# Altium footprint library CI.PcbLib: 42 footprints (part 1 of 3)
Each footprint in its own frame and in the unit in brackets; x right, y up, seen from the top. Pads: shape width x height; smd on the part's side, far side on the other; paste and mask are expansions set on the pad; w line width, h text height; cw(c..) or ccw(c..) is an arc to the next point about the centre after c.
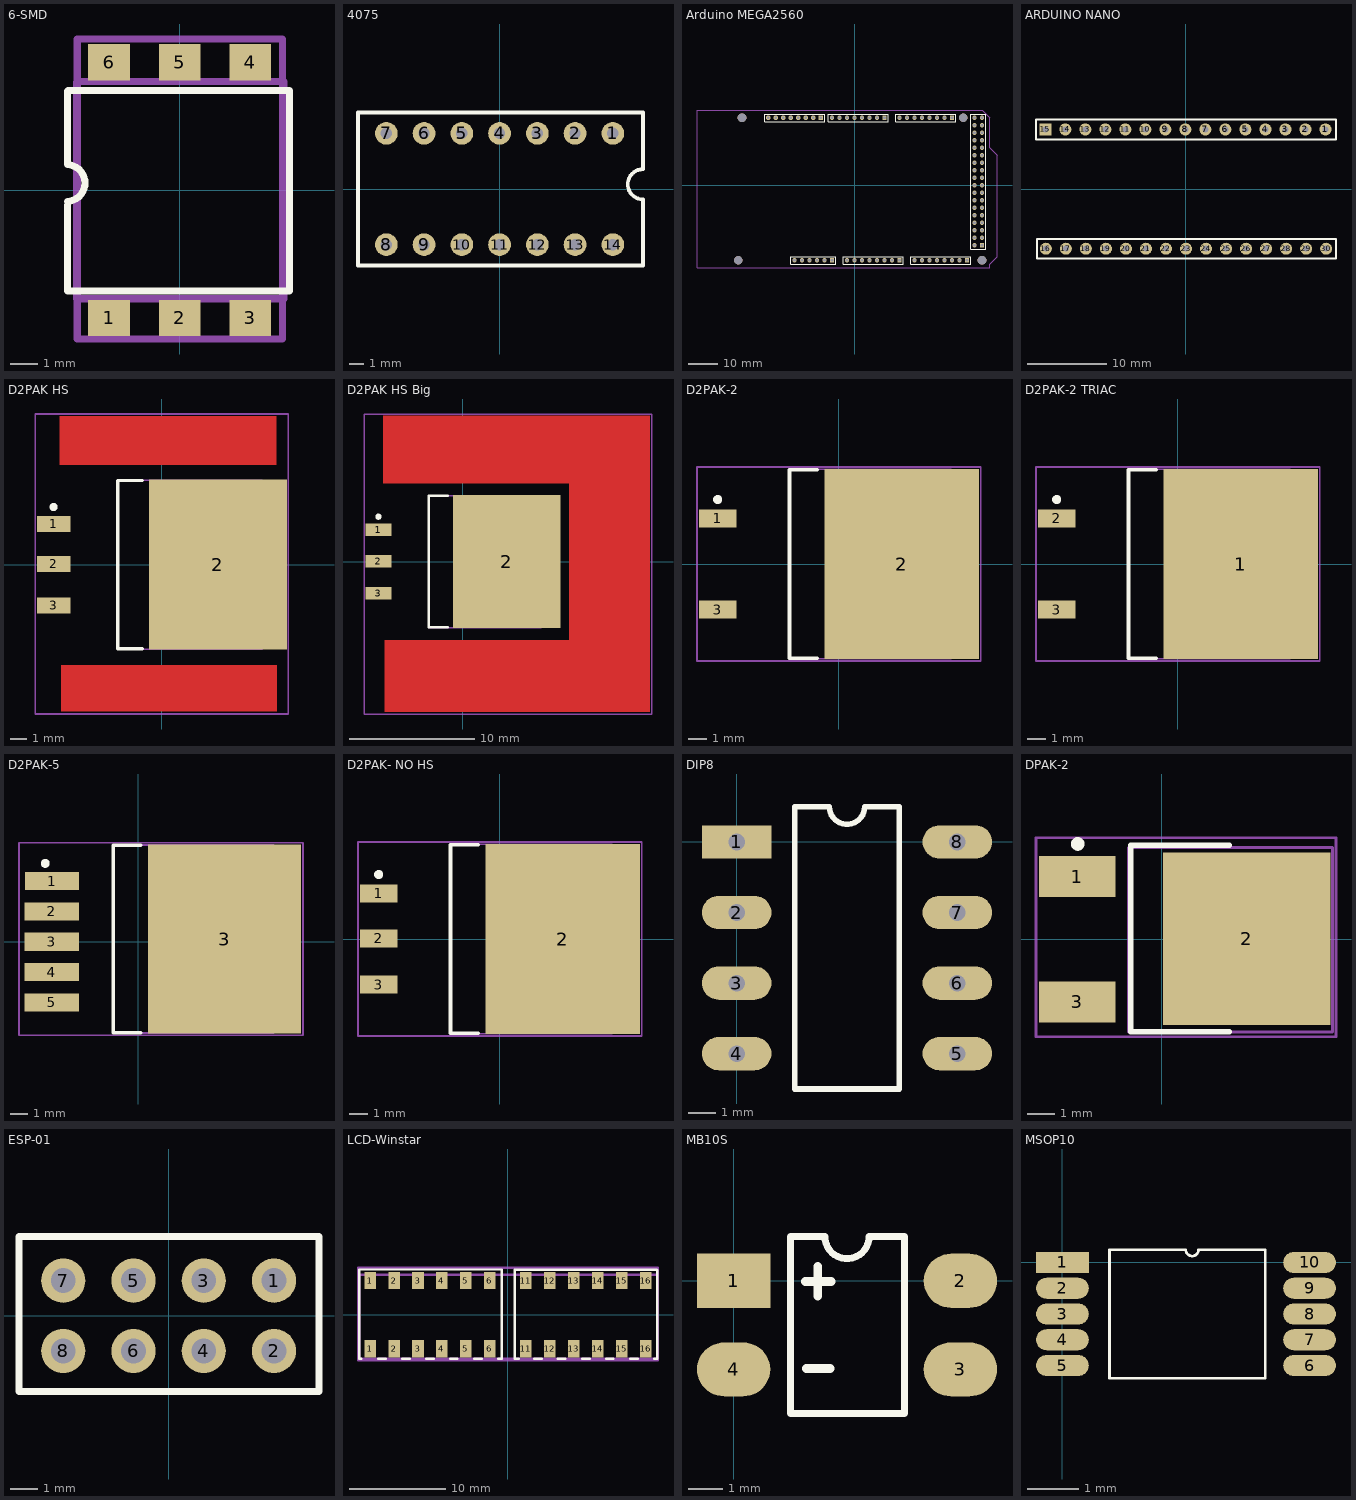
[diagram p0: the footprints below, top view; thin cyan lines are the x and y axes]

## 6-SMD [mm] "SMD IC 6 pins"
pads (6):
  rect 1.5x1.3 smd: 1(-2.54,-4.6) 2(0,-4.6) 3(2.54,-4.6) 4(2.54,4.6) 5(0,4.6) 6(-2.54,4.6)
Top Overlay:
  lines w0.254: -4.039,-0.531 -4.039,-3.63 3.962,-3.63 3.962,3.584 -4.013,3.584 ; -4.039,3.559 -4.039,0.917 cw(c-4.064,0.257) -4.038,-0.404
Mechanical 13:
  lines w0.254: -3.708,3.889 -3.708,-3.909 3.759,-3.909 3.759,3.914 -3.683,3.914
Mechanical 15:
  lines w0.254: -3.683,-5.357 3.708,-5.357 3.708,5.438 -3.683,5.438 -3.683,-5.357
3D body: height 3.61, standoff 0, extent -3.658,-5.052 3.632,5.108

## 4075 [mil] "4075 DIP14 Package"
pads (14):
  round 60 hole 30: 1(300,147.5) 2(200,147.5) 3(100,147.5) 4(0,147.5) 5(-100,147.5) 6(-200,147.5) 7(-300,147.5) 8(-300,-147.5) 9(-200,-147.5) 10(-100,-147.5) 11(0,-147.5) 12(100,-147.5) 13(200,-147.5) 14(300,-147.5)
Top Overlay:
  lines w10: -375,-202.5 380,-202.5 380,-27.5 cw(c379.69,12.5) 380,52.5 380,202.5 -375,202.5 -375,-202.5
3D body: height 326.77, standoff -98.43, extent -379.92,-197.11 379.92,202.1

## Arduino MEGA2560 [mm] "Arduino Mega2560"
pads (82):
  rect 1.5x1.5 hole 0.9: 0(10.16,22.86) 8(-11.43,22.86) 21(33.02,22.86) 59(-7.62,-25.4) 67(15.24,-25.4) 75(38.1,-25.4) 79(43.18,-20.32)
  round 1.5 hole 0.9: 1(7.62,22.86) 2(5.08,22.86) 3(2.54,22.86) 4(0,22.86) 5(-2.54,22.86) 6(-5.08,22.86) 7(-7.62,22.86) 9(-13.97,22.86) 10(-16.51,22.86) 11(-19.05,22.86) 12(-21.59,22.86) 13(-24.13,22.86) 14(15.24,22.86) 15(17.78,22.86) 16(20.32,22.86) 17(22.86,22.86) 18(25.4,22.86) 19(27.94,22.86) 20(30.48,22.86) 22(40.64,20.32) 23(43.18,20.32) 24(40.64,17.78) 25(43.18,17.78) 26(40.64,15.24) 27(43.18,15.24) 28(40.64,12.7) 29(43.18,12.7) 30(40.64,10.16) 31(43.18,10.16) 32(40.64,7.62) 33(43.18,7.62) 34(40.64,5.08) 35(43.18,5.08) 36(40.64,2.54) 37(43.18,2.54) 38(40.64,0) 39(43.18,0) 40(40.64,-2.54) 41(43.18,-2.54) 42(40.64,-5.08) 43(43.18,-5.08) 44(40.64,-7.62) 45(43.18,-7.62) 46(40.64,-10.16) 47(43.18,-10.16) 48(40.64,-12.7) 49(43.18,-12.7) 50(40.64,-15.24) 51(43.18,-15.24) 52(40.64,-17.78) 53(43.18,-17.78) 54(-20.32,-25.4) 55(-17.78,-25.4) 56(-15.24,-25.4) 57(-12.7,-25.4) 58(-10.16,-25.4) 60(-2.54,-25.4) 61(0,-25.4) 62(2.54,-25.4) 63(5.08,-25.4) 64(7.62,-25.4) 65(10.16,-25.4) 66(12.7,-25.4) 68(20.32,-25.4) 69(22.86,-25.4) 70(25.4,-25.4) 71(27.94,-25.4) 72(30.48,-25.4) 73(33.02,-25.4) 74(35.56,-25.4) 76(-26.67,22.86) 77(-29.21,22.86) 78(40.64,-20.32) 80(43.18,22.86) 81(40.64,22.86)
via -39.37,-25.4 diameter 3 hole 3
via -38.1,22.86 diameter 3 hole 3
via 36.83,22.86 diameter 3 hole 3
via 43.18,-25.4 diameter 3 hole 3
Top Overlay:
  lines w0.2: -30.48,21.59 -30.48,24.13 -10.16,24.13 -10.16,21.59 -30.48,21.59 ; -21.59,-26.67 -6.35,-26.67 -6.35,-24.13 -21.59,-24.13 -21.59,-26.67 ; -8.89,21.59 -8.89,24.13 11.43,24.13 11.43,21.59 -8.89,21.59 ; -3.81,-26.67 -3.81,-24.13 16.51,-24.13 16.51,-26.67 -3.81,-26.67 ; 13.97,21.59 34.29,21.59 34.29,24.13 13.97,24.13 13.97,21.59 ; 19.05,-26.67 19.05,-24.13 39.37,-24.13 39.37,-26.67 19.05,-26.67 ; 39.37,-21.59 39.37,24.13 44.45,24.13 44.45,-21.59 39.37,-21.59
Mechanical 13:
  lines w0.254: 45.72,12.69 48.26,10.15 48.26,-24.13 45.72,-26.67 45.72,-27.94 -51.7,-27.94 -53.34,-27.94 -53.34,-26.3 -53.34,25.4 43.18,25.4 45.72,22.86 45.72,12.7
3D body: height 3.2, standoff -9.5, extent -30.683,-26.645 44.501,24.155

## ARDUINO NANO [mil] "Arduino Nano"
pads (30):
  round 60 hole 30: 1(698.5,298) 2(598.5,298) 3(498.5,298) 4(398.5,298) 5(298.5,298) 6(198.5,298) 7(98.5,298) 8(-1.5,298) 9(-101.5,298) 10(-201.5,298) 11(-301.5,298) 12(-401.5,298) 13(-501.5,298) 14(-601.5,298) 16(-698.5,-298) 17(-598.5,-298) 18(-498.5,-298) 19(-398.5,-298) 20(-298.5,-298) 21(-198.5,-298) 22(-98.5,-298) 23(1.5,-298) 24(101.5,-298) 25(201.5,-298) 26(301.5,-298) 27(401.5,-298) 28(501.5,-298) 29(601.5,-298) 30(701.5,-298)
  rect 60x60 hole 30: 15(-701.5,298)
Top Overlay:
  lines w10: -748,249 751,249 751,347 -748,347 -748,249 ; -744,-346 -744,-250 751,-250 751,-346 -744,-346
3D body: height 826.77, standoff -124.02, extent -859.83,-355 911.83,353.66

## D2PAK HS [mm] "D2-PAK, TO263-3, with Heatsink"
height 4.69
pads (4):
  rect 2.1x1 smd: 1(-6.75,2.54) 2(-6.75,0.04) 3(-6.75,-2.54)
  rect 8.6x10.6 smd: 2(3.5,0)
Top Layer:
  rectangle: -6.274,-9.169 7.188,-6.274
  rectangle: -6.375,6.223 7.163,9.271
Top Overlay:
  circle w0.25: c-6.75,3.59 r0.125
  lines w0.2: -1.2,-5.25 -2.75,-5.25 -2.75,5.25 -1.2,5.25
Mechanical 13:
  lines w0.1: -2.75,-5.275 -2.75,5.275 6.25,5.275 6.25,-5.275 -2.75,-5.275
Mechanical 15:
  lines w0.1: -0.5,0 0.5,0 ; 0,-0.5 0,0.5 ; -7.9,-9.322 -7.9,9.398 7.9,9.398 7.9,-9.322 -7.9,-9.322
3D body: height 10.07, standoff -0.12, extent -7.497,-13.115 6.895,13.103

## D2PAK HS Big [mm] "D2-PAK, TO263-3, with Big Heatsink"
height 4.69
pads (4):
  rect 2.1x1 smd: 1(-6.75,2.54) 2(-6.75,0.04) 3(-6.75,-2.54)
  rect 8.6x10.6 smd: 2(3.5,0)
Top Layer:
  rectangle: 8.458,-12.014 14.935,11.684
  rectangle: -6.375,6.223 13.843,11.684
  rectangle: -6.274,-12.014 14.173,-6.274
Top Overlay:
  circle w0.25: c-6.75,3.59 r0.125
  lines w0.2: -1.2,-5.25 -2.75,-5.25 -2.75,5.25 -1.2,5.25
Mechanical 13:
  lines w0.1: -2.75,-5.275 6.25,-5.275 6.25,5.275 -2.75,5.275 -2.75,-5.275
Mechanical 15:
  lines w0.1: -0.5,0 0.5,0 ; 0,-0.5 0,0.5 ; -7.9,-12.167 15.088,-12.167 15.088,11.786 -7.9,11.786 -7.9,-12.167
3D body: height 10.07, standoff -0.12, extent -7.497,-13.115 6.895,13.103

## D2PAK-2 [mm] "D2-PAK, 4-Leads, Body 8.8x10.4mm, Pitch 2.54mm, Lead Span 15.1mm, IPC High Density"
height 4.69
pads (3):
  rect 2.1x1 smd: 1(-6.75,2.54) 3(-6.75,-2.54)
  rect 8.6x10.6 smd: 2(3.5,0)
Top Overlay:
  circle w0.25: c-6.75,3.59 r0.125
  lines w0.2: -1.2,-5.25 -2.75,-5.25 -2.75,5.25 -1.2,5.25
Mechanical 13:
  lines w0.1: -2.75,-5.275 6.25,-5.275 6.25,5.275 -2.75,5.275 -2.75,-5.275
Mechanical 15:
  lines w0.1: -0.5,0 0.5,0 ; 0,-0.5 0,0.5 ; -7.9,-5.4 7.9,-5.4 7.9,5.4 -7.9,5.4 -7.9,-5.4
3D body: height 4.88, standoff -0.13, extent -7.714,-5.055 7.549,5.105

## D2PAK-2 TRIAC [mm] "BTA225B-600B"
height 4.69
pads (3):
  rect 8.6x10.6 smd: 1(3.5,0)
  rect 2.1x1 smd: 2(-6.75,2.54) 3(-6.75,-2.54)
Top Overlay:
  circle w0.25: c-6.75,3.59 r0.125
  lines w0.2: -1.2,-5.25 -2.75,-5.25 -2.75,5.25 -1.2,5.25
Mechanical 13:
  lines w0.1: -2.75,-5.275 -2.75,5.275 6.25,5.275 6.25,-5.275 -2.75,-5.275
Mechanical 15:
  lines w0.1: -0.5,0 0.5,0 ; 0,-0.5 0,0.5 ; -7.9,-5.4 -7.9,5.4 7.9,5.4 7.9,-5.4 -7.9,-5.4
3D body: height 4.88, standoff -0.13, extent -7.714,-5.055 7.549,5.105

## D2PAK-5 [mm] "D2-PAK, TO263-5, No Heatsink"
height 4.69
pads (6):
  rect 3.05x1.016 smd: 1(-4.823,3.404) 2(-4.849,1.702) 3(-4.849,0) 4(-4.849,-1.702) 5(-4.849,-3.404)
  rect 8.6x10.6 smd: 3(4.849,0.153)
Top Overlay:
  circle w0.25: c-5.204,4.395 r0.125
  lines w0.2: 0.149,-5.097 -1.401,-5.097 -1.401,5.403 0.149,5.403
Mechanical 13:
  lines w0.1: -1.401,-5.122 7.599,-5.122 7.599,5.428 -1.401,5.428 -1.401,-5.122
Mechanical 15:
  lines w0.1: 0.849,0.153 1.849,0.153 ; 1.349,-0.347 1.349,0.653 ; -6.678,-5.247 -6.678,5.553 9.249,5.553 9.249,-5.247 -6.678,-5.247
3D body: height 4.87, standoff 0, extent -5.488,-5.029 8.742,5.131

## D2PAK- NO HS [mm] "D2-PAK, TO263-3, No Heatsink"
height 4.69
pads (4):
  rect 2.1x1 smd: 1(-6.75,2.54) 2(-6.75,0.04) 3(-6.75,-2.54)
  rect 8.6x10.6 smd: 2(3.5,0)
Top Overlay:
  circle w0.25: c-6.75,3.59 r0.125
  lines w0.2: -1.2,-5.25 -2.75,-5.25 -2.75,5.25 -1.2,5.25
Mechanical 13:
  lines w0.1: -2.75,-5.275 -2.75,5.275 6.25,5.275 6.25,-5.275 -2.75,-5.275
Mechanical 15:
  lines w0.1: -0.5,0 0.5,0 ; 0,-0.5 0,0.5 ; -7.9,-5.4 -7.9,5.4 7.9,5.4 7.9,-5.4 -7.9,-5.4
3D body: height 4.87, standoff 0, extent -7.472,-5.055 6.758,5.105

## DIP8 [mm]
pads (8):
  rect 2.5x1.2 hole 0.6: 1(0,0)
  oval 2.5x1.2 hole 0.6: 2(0,-2.54) 3(0,-5.08) 4(0,-7.62) 5(7.94,-7.62) 6(7.94,-5.08) 7(7.94,-2.54) 8(7.94,0)
Top Overlay:
  lines w0.2: 2.085,-8.89 2.085,1.27 3.335,1.27 ccw(c3.97,1.27) 4.605,1.27 5.855,1.27 5.855,-8.89 2.085,-8.89
3D body: height 4.9, standoff -2.71, extent -1.394,-9.234 9.015,1.766

## DPAK-2 [mm] "DPAK Package"
pads (3):
  rect 2.8x1.5 smd: 1(-3.094,2.286) 3(-3.094,-2.286)
  rect 6.1x6.3 smd: 2(3.094,0.025)
Top Overlay:
  circle w0.25: c-3.073,3.48 r0.125
  lines w0.2: 2.456,-3.378 -1.145,-3.378 -1.145,3.429 2.456,3.429
Mechanical 13:
  lines w0.1: -1.221,-3.378 -1.221,3.353 6.223,3.353 6.223,-3.378 -1.221,-3.378
Mechanical 15:
  lines w0.1: 3.156,-0.254 4.156,-0.254 ; 3.656,-0.754 3.656,0.246 ; -4.597,-3.556 -4.597,3.708 6.35,3.708 6.35,-3.556 -4.597,-3.556
3D body: height 2.37, standoff -0.03, extent -4.068,-3.393 6.032,3.341

## ESP-01 [mm] "ESP8266 WiFi Module"
pads (8):
  round 1.6 hole 0.9: 1(3.81,1.27) 2(3.81,-1.27) 3(1.27,1.27) 4(1.27,-1.27) 5(-1.27,1.27) 6(-1.27,-1.27) 7(-3.81,1.27) 8(-3.81,-1.27)
Top Overlay:
  lines w0.254: -5.41,-2.743 5.436,-2.743 5.436,2.87 -5.41,2.87 -5.41,-2.743
3D body: height 10.48, standoff -3.15, extent -7.337,-2.743 7.163,22.057

## LCD-Winstar [mm] "AVX Poke-Home 12 ways for LCD Winstar"
pads (24):
  rect 1.2x1.8 smd: 1(-14.375,-3.55) 1(-14.375,3.55) 2(-11.875,-3.55) 2(-11.875,3.55) 3(-9.375,-3.55) 3(-9.375,3.55) 4(-6.875,-3.55) 4(-6.875,3.55) 5(-4.375,-3.55) 5(-4.375,3.55) 6(-1.875,-3.55) 6(-1.875,3.55) 11(1.875,-3.55) 11(1.875,3.55) 12(4.375,-3.55) 12(4.375,3.55) 13(6.875,-3.55) 13(6.875,3.55) 14(9.375,-3.55) 14(9.375,3.55) 15(11.875,-3.55) 15(11.875,3.55) 16(14.375,-3.55) 16(14.375,3.55)
Top Overlay:
  lines w0.254: -15.273,-4.623 -15.502,-4.623 -15.502,4.699 -0.643,4.699 -0.643,-4.58 ; -13.521,-4.597 -12.733,-4.597 ; -11.019,-4.597 -10.231,-4.597 ; -8.504,-4.597 -7.717,-4.597 ; -6.028,-4.623 -5.273,-4.623 ; -3.521,-4.597 -2.733,-4.597 ; -1.019,-4.597 -0.643,-4.597 ; 0.729,-4.605 0.729,4.674 15.527,4.674 15.553,4.648 15.553,-4.623 15.222,-4.623 ; 0.769,-4.623 1.145,-4.623 ; 2.746,-4.597 3.533,-4.597 ; 5.212,-4.623 5.999,-4.623 ; 7.746,-4.597 8.533,-4.597 ; 10.216,-4.623 11.003,-4.623 ; 12.746,-4.597 13.533,-4.597
Mechanical 13:
  lines w0.254: -5.697,-4.597 -15.502,-4.597 -15.502,4.166 -5.443,4.166 ; -5.502,-4.597 15.553,-4.597 ; -5.502,4.166 15.553,4.166 ; 15.553,-4.597 15.553,4.166 ; 15.553,-4.597 15.553,4.166
Mechanical 15:
  lines w0.254: -5.697,4.902 -15.629,4.902 -15.629,-4.775 -5.57,-4.775 ; -5.629,-4.775 15.639,-4.775 15.639,4.902 -5.629,4.902
3D body: height 5.1, standoff 0, extent -15.65,-4.572 15.6,4.428

## MB10S [mm] "MB10S 0.5A Bridge Rectifiers SOIC-4"
pads (4):
  rect 2.1x1.55 smd: 1(0,0)
  oval 2.1x1.55 smd: 2(6.5,0) 3(6.5,-2.54) 4(0,-2.54)
Top Overlay:
  lines w0.2: 1.626,-3.81 1.626,1.27 2.615,1.27 ccw(c3.25,1.27) 3.885,1.27 4.902,1.27 4.902,-3.81 1.626,-3.81
  lines w0.254: 2.057,-0.025 2.794,-0.025 ; 2.083,-2.515 2.769,-2.515 ; 2.413,-0.432 2.413,0.406
3D body: height 2.9, standoff 0, extent -0.015,-3.77 6.67,1.18

## MSOP10 [mm] "10-Lead Mini Small Outline Package [MSOP]  (RM-10)"
pads (10):
  rect 1.025x0.41 smd: 1(0,0)
  oval 1.025x0.41 smd: 2(0,-0.5) 3(0,-1) 4(0,-1.5) 5(0,-2) 6(4.8,-2) 7(4.8,-1.5) 8(4.8,-1) 9(4.8,-0.5) 10(4.8,0)
Top Overlay:
  lines w0.05: 2.388,0.25 0.914,0.25 0.914,-2.25 3.937,-2.25 3.937,0.25 2.642,0.25 ; 2.395,0.25 ccw(c2.52,0.25) 2.645,0.25
3D body: height 1.05, standoff 0, extent -0.126,-2.492 4.901,0.508